# Altium footprint library 自建库.PcbLib: 169 footprints (part 7 of 11)
Each footprint in its own frame and in the unit in brackets; x right, y up, seen from the top. Pads: shape width x height; smd on the part's side, far side on the other; paste and mask are expansions set on the pad; w line width, h text height; cw(c..) or ccw(c..) is an arc to the next point about the centre after c.
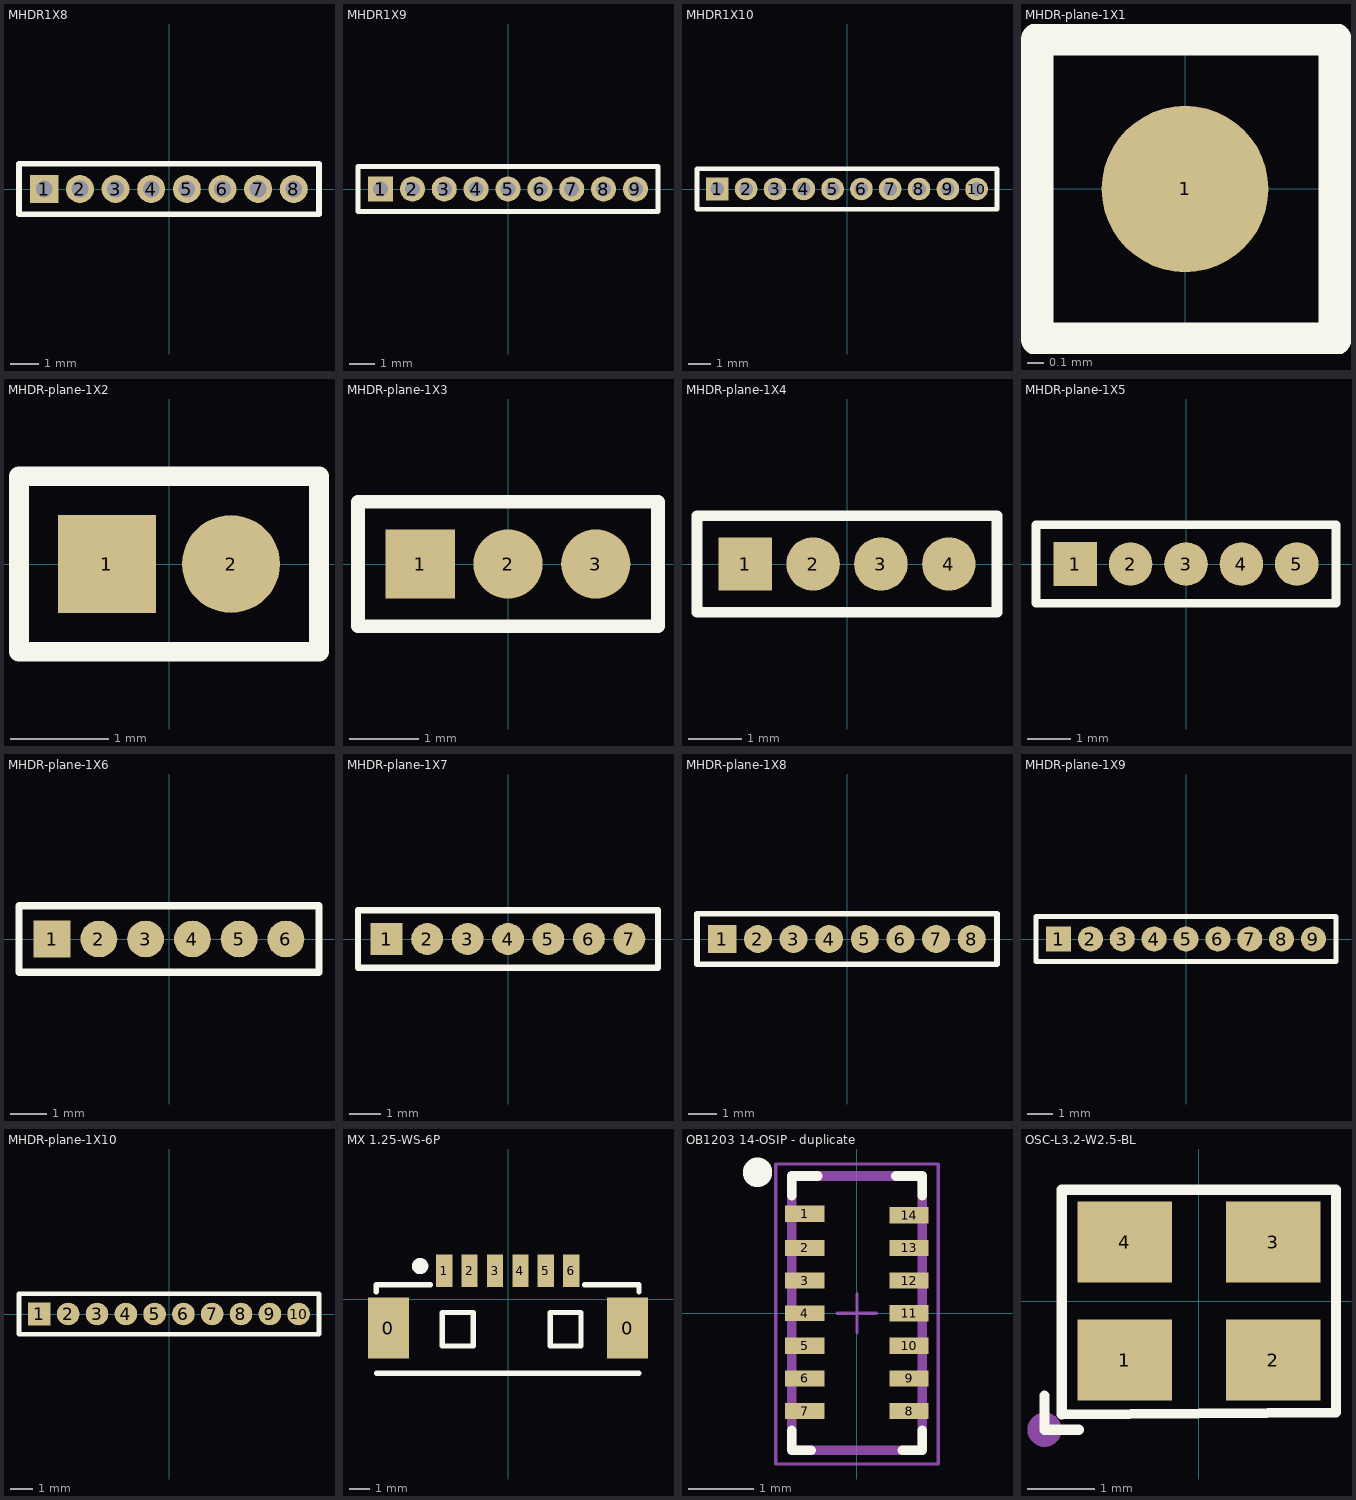
[diagram p6: the footprints below, top view; thin cyan lines are the x and y axes]

## MHDR1X8 [mm] "Connector; Header; 8 Position"
pads (8):
  rect 1x1 hole 0.6: 1(-4.445,0)
  round 1 hole 0.6: 2(-3.175,0) 3(-1.905,0) 4(-0.635,0) 5(0.635,0) 6(1.905,0) 7(3.175,0) 8(4.445,0)
Top Overlay:
  lines w0.2: -5.345,-0.9 -5.345,0.9 5.345,0.9 5.345,-0.9 -5.345,-0.9

## MHDR1X9 [mm] "Connector; Header; 9 Position"
pads (9):
  rect 1x1 hole 0.6: 1(-5.08,0)
  round 1 hole 0.6: 2(-3.81,0) 3(-2.54,0) 4(-1.27,0) 5(0,0) 6(1.27,0) 7(2.54,0) 8(3.81,0) 9(5.08,0)
Top Overlay:
  lines w0.2: -5.98,-0.9 -5.98,0.9 5.98,0.9 5.98,-0.9 -5.98,-0.9

## MHDR1X10 [mm] "Connector; Header; 10 Position"
pads (10):
  rect 1x1 hole 0.6: 1(-5.715,0)
  round 1 hole 0.6: 2(-4.445,0) 3(-3.175,0) 4(-1.905,0) 5(-0.635,0) 6(0.635,0) 7(1.905,0) 8(3.175,0) 9(4.445,0) 10(5.715,0)
Top Overlay:
  lines w0.2: -6.615,-0.9 6.615,-0.9 6.615,0.9 -6.615,0.9 -6.615,-0.9

## MHDR-plane-1X1 [mm] "Connector; Header; 2 Position"
pads (1):
  round 1 smd: 1(0,0)
Top Overlay:
  lines w0.2: -0.889,-0.9 0.9,-0.9 0.9,0.9 -0.889,0.9 -0.889,-0.9

## MHDR-plane-1X2 [mm] "Connector; Header; 2 Position"
pads (2):
  rect 1x1 smd: 1(-0.635,0)
  round 1 smd: 2(0.635,0)
Top Overlay:
  lines w0.2: -1.535,-0.9 -1.535,0.9 1.535,0.9 1.535,-0.9 -1.535,-0.9

## MHDR-plane-1X3 [mm] "Connector; Header; 3 Position"
pads (3):
  rect 1x1 smd: 1(-1.27,0)
  round 1 smd: 2(0,0) 3(1.27,0)
Top Overlay:
  lines w0.2: -2.17,-0.9 -2.17,0.9 2.17,0.9 2.17,-0.9 -2.17,-0.9

## MHDR-plane-1X4 [mm] "Connector; Header; 4 Position"
pads (4):
  rect 1x1 smd: 1(-1.905,0)
  round 1 smd: 2(-0.635,0) 3(0.635,0) 4(1.905,0)
Top Overlay:
  lines w0.2: -2.805,-0.9 -2.805,0.9 2.805,0.9 2.805,-0.9 -2.805,-0.9

## MHDR-plane-1X5 [mm] "Connector; Header; 5 Position"
pads (5):
  rect 1x1 smd: 1(-2.54,0)
  round 1 smd: 2(-1.27,0) 3(0,0) 4(1.27,0) 5(2.54,0)
Top Overlay:
  lines w0.2: -3.44,-0.9 -3.44,0.9 3.44,0.9 3.44,-0.9 -3.44,-0.9

## MHDR-plane-1X6 [mm] "Connector; Header; 6 Position"
pads (6):
  rect 1x1 smd: 1(-3.175,0)
  round 1 smd: 2(-1.905,0) 3(-0.635,0) 4(0.635,0) 5(1.905,0) 6(3.175,0)
Top Overlay:
  lines w0.2: -4.075,-0.9 4.075,-0.9 4.075,0.9 -4.075,0.9 -4.075,-0.9

## MHDR-plane-1X7 [mm] "Connector; Header; 7 Position"
pads (7):
  rect 1x1 smd: 1(-3.81,0)
  round 1 smd: 2(-2.54,0) 3(-1.27,0) 4(0,0) 5(1.27,0) 6(2.54,0) 7(3.81,0)
Top Overlay:
  lines w0.2: -4.71,-0.9 4.71,-0.9 4.71,0.9 -4.71,0.9 -4.71,-0.9

## MHDR-plane-1X8 [mm] "Connector; Header; 8 Position"
pads (8):
  rect 1x1 smd: 1(-4.445,0)
  round 1 smd: 2(-3.175,0) 3(-1.905,0) 4(-0.635,0) 5(0.635,0) 6(1.905,0) 7(3.175,0) 8(4.445,0)
Top Overlay:
  lines w0.2: -5.345,-0.9 -5.345,0.9 5.345,0.9 5.345,-0.9 -5.345,-0.9

## MHDR-plane-1X9 [mm] "Connector; Header; 9 Position"
pads (9):
  rect 1x1 smd: 1(-5.08,0)
  round 1 smd: 2(-3.81,0) 3(-2.54,0) 4(-1.27,0) 5(0,0) 6(1.27,0) 7(2.54,0) 8(3.81,0) 9(5.08,0)
Top Overlay:
  lines w0.2: -5.98,-0.9 5.98,-0.9 5.98,0.9 -5.98,0.9 -5.98,-0.9

## MHDR-plane-1X10 [mm] "Connector; Header; 10 Position"
pads (10):
  rect 1x1 smd: 1(-5.715,0)
  round 1 smd: 2(-4.445,0) 3(-3.175,0) 4(-1.905,0) 5(-0.635,0) 6(0.635,0) 7(1.905,0) 8(3.175,0) 9(4.445,0) 10(5.715,0)
Top Overlay:
  lines w0.2: -6.615,-0.9 -6.615,0.9 6.615,0.9 6.615,-0.9 -6.615,-0.9

## MX 1.25-WS-6P [mm] "长：12.65mm，宽：4.2mm，高：3.4mm"
pads (8):
  rect 2x3 smd: 0(-5.882,-1.405) 0(5.882,-1.405)
  rect 0.8x1.6 smd: 1(-3.139,1.405) 2(-1.889,1.405) 3(-0.639,1.405) 4(0.611,1.405) 5(1.861,1.405) 6(3.111,1.405)
Top Overlay:
  circle w0.4: c-4.324,1.643 r0.2
  lines w0.254: -6.483,0.373 -6.483,0.728 -3.816,0.728 ; -6.456,-3.633 6.451,-3.633 ; 3.778,0.728 6.445,0.728 6.445,0.373 ; -3.232,-2.294 -1.708,-2.294 -1.708,-0.643 -3.232,-0.643 -3.232,-2.294 ; 2.076,-2.294 3.6,-2.294 3.6,-0.643 2.076,-0.643 2.076,-2.294
3D body "MOLEX1.25-WS-6P.STEP": height 3.4, standoff 0, extent -6.325,-3.005 6.325,2.185

## OB1203 14-OSIP - duplicate [mm] "14-OSIP 2X4.2X1.2mm"
height 0.8
pads (14):
  rect 0.6x0.25 smd paste-0.025 mask+0.051: 1(-0.8,1.524) 2(-0.8,1) 3(-0.8,0.5) 5(-0.8,-0.5) 6(-0.8,-1) 7(-0.8,-1.5) 8(0.8,-1.5) 9(0.8,-1) 10(0.8,-0.5) 11(0.8,0) 12(0.8,0.5) 13(0.8,1) 14(0.8,1.499)
  rect 0.6x0.24 smd paste-0.025 mask+0.051: 4(-0.8,0)
Top Overlay:
  circle w0.4: c-1.524,2.159 r0.025
  lines w0.15: -1,-1.8 -1,-2.1 -0.7,-2.1 ; -1,1.8 -1,2.1 -0.6,2.1 ; 0.6,2.1 1,2.1 1,1.8 ; 0.7,-2.1 1,-2.1 1,-1.8
Mechanical 13:
  lines w0.15: -1,-2.1 -1,2.1 1,2.1 1,-2.1 -1,-2.1
Mechanical 15:
  lines w0.05: -0.3,0 0,0 0.3,0 ; 0,-0.3 0,0.3 ; -1.245,-2.311 -1.245,2.286 1.245,2.286 1.245,-2.311 -1.245,-2.311
3D body: height 2, standoff 0, extent -1,-2.1 1,2.1

## OSC-L3.2-W2.5-BL [mm]
pads (4):
  rect 1.4x1.2 smd: 1(-1.1,-0.875) 2(1.1,-0.875) 3(1.1,0.875) 4(-1.1,0.875)
Top Overlay:
  lines w0.152: -2.286,-1.397 -2.286,-1.905 -1.778,-1.905 ; -2.029,-1.679 -2.029,1.651 2.032,1.651 2.032,0 2.032,-1.651 -2.029,-1.679
Mechanical 15:
  circle w0.254: c-2.286,-1.905 r0.127
  region: -1.486,-0.428 -1.45,-0.428 -1.45,-1.004 -1.486,-1.004
  region: -1.522,-0.428 -1.486,-0.428 -1.486,-1.004 -1.522,-1.004
  region: -1.558,-0.428 -1.522,-0.428 -1.522,-1.004 -1.558,-1.004
  region: -1.594,-0.464 -1.558,-0.464 -1.558,-1.004 -1.594,-1.004
  region: -1.63,-0.464 -1.594,-0.464 -1.594,-0.572 -1.63,-0.572
  region: -1.666,-0.5 -1.63,-0.5 -1.63,-0.608 -1.666,-0.608
  region: -1.702,-0.536 -1.666,-0.536 -1.666,-0.608 -1.702,-0.608
  region: -1.738,-0.536 -1.702,-0.536 -1.702,-0.608 -1.738,-0.608
3D body "OSC-3225_4P.STEP": height 1.05, standoff 0, extent -1.6,-1.25 1.6,1.25